# Altium footprint library Power_Lib_Altium.PcbLib: 383 footprints (part 6 of 24)
Each footprint in its own frame and in the unit in brackets; x right, y up, seen from the top. Pads: shape width x height; smd on the part's side, far side on the other; paste and mask are expansions set on the pad; w line width, h text height; cw(c..) or ccw(c..) is an arc to the next point about the centre after c.
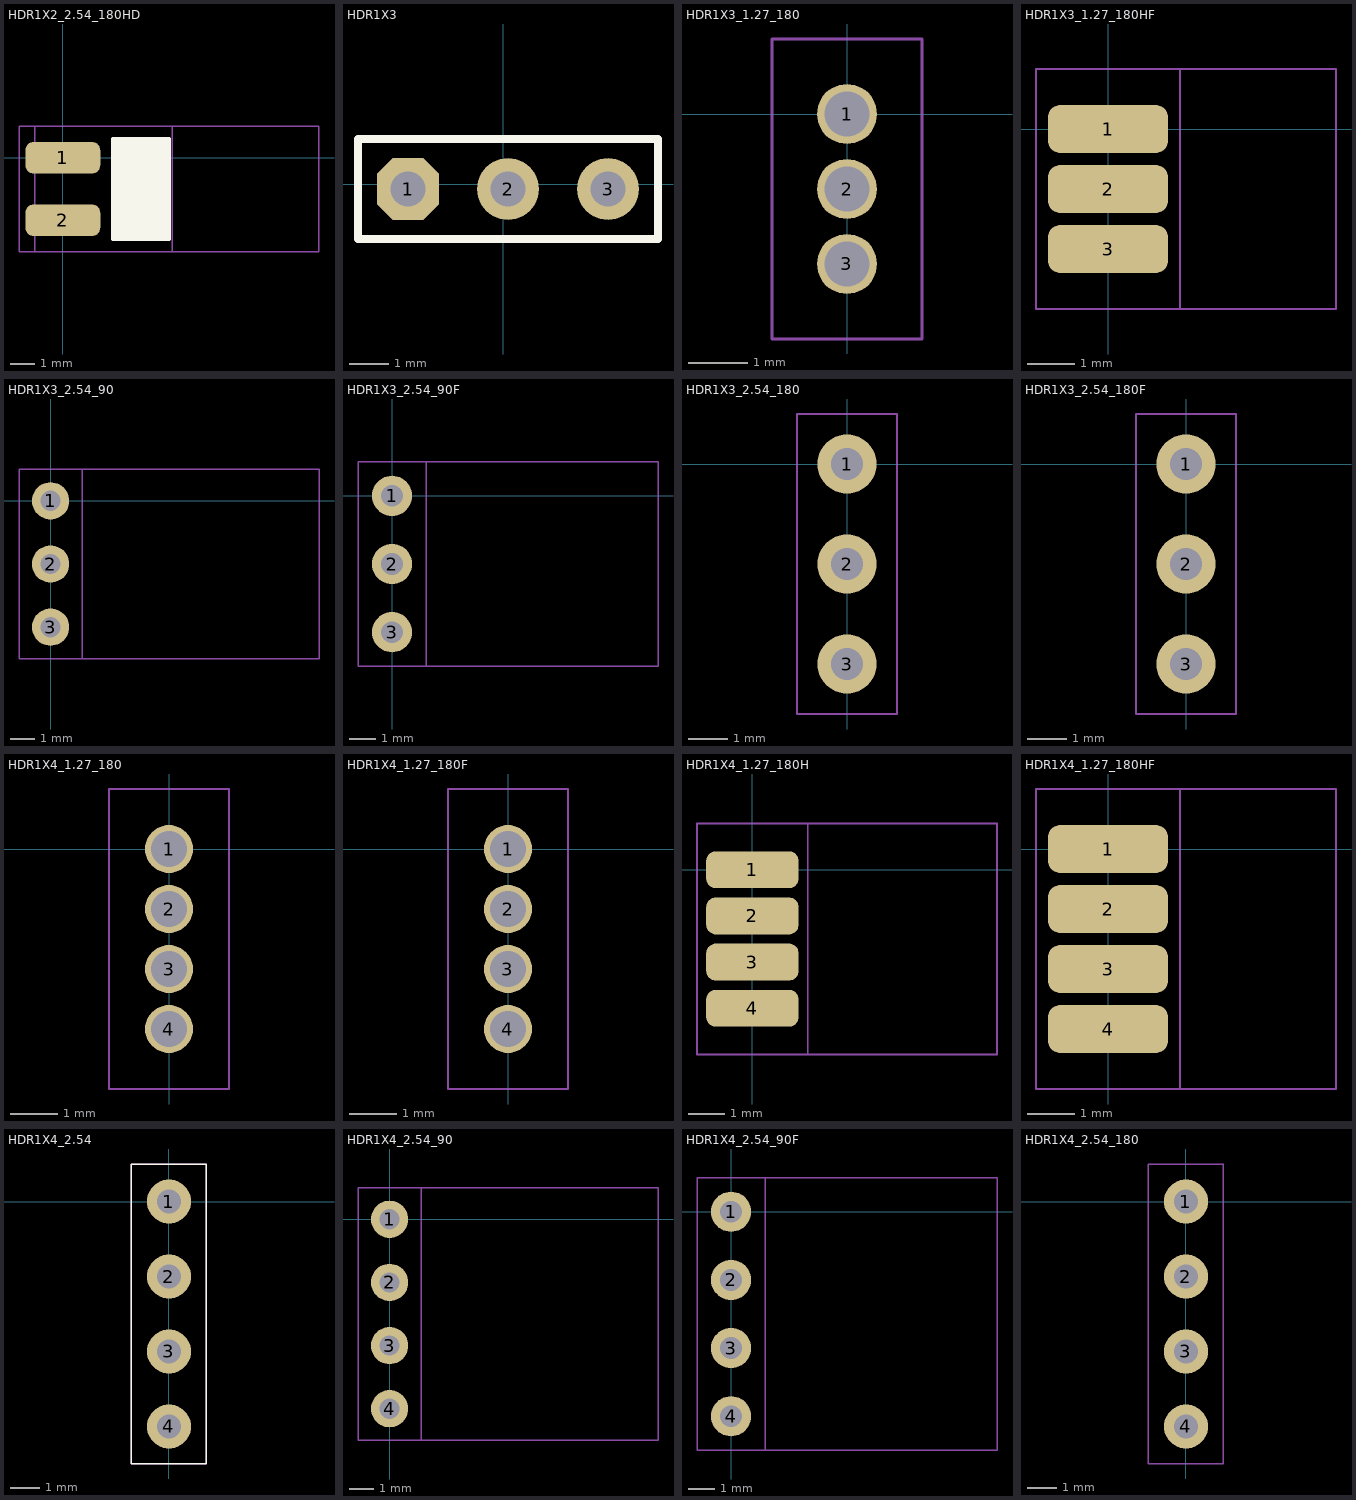
[diagram p5: the footprints below, top view; thin cyan lines are the x and y axes]

## HDR1X2_2.54_180HD [mil]
height 169.29
pads (2):
  rrect50% 120x50 smd: 1(0,0) 2(0,-100)
Top Overlay:
  region: 80,30 170,30 170,-130 80,-130
  lines w6: 80,-130 80,30 170,30 170,-130 80,-130
Mechanical 13:
  lines w2: -45,-150 -45,50 409.65,50 409.65,-150 -45,-150
Mechanical 14:
  lines w2: -70,-150 175,-150 175,50 -70,50 -70,-150
3D body "pin_header_aw140-eg-g02d.stp": height 101.32, standoff 2.95, extent -45.47,-150 395.47,50

## HDR1X3 [mil]
pads (3):
  oct 62x62 hole 35: 1(-95,-5)
  round 62 hole 35: 2(5,-5) 3(105,-5)
Top Overlay:
  lines w8: -145,-55 -145,45 155,45 155,-55 -145,-55
3D body "User Library-Header Vertical 2_54mm Pitch2-11 Way.SLDPRT": height 233.86, standoff -115.75, extent -46,-54.99 54,45.01
3D body "User Library-Header Vertical 2_54mm Pitch2-11 Way.SLDPRT": height 233.86, standoff -115.75, extent -146,-54.99 -46,45.01
3D body "User Library-Header Vertical 2_54mm Pitch2-11 Way.SLDPRT": height 233.86, standoff -115.75, extent 54,-54.99 154,45.01

## HDR1X3_1.27_180 [mil]
height 169.29
pads (3):
  round 40 hole 30: 1(0,0) 2(0,-50) 3(0,-100)
Mechanical 13:
  lines w2: -50,-150 -50,50 50,50 50,-150 -50,-150
Mechanical 14:
  lines w2: -50,-150 -50,50 50,50 50,-150 -50,-150

## HDR1X3_1.27_180HF [mil]
height 169.29
pads (3):
  rrect50% 100x40 smd: 1(0,0) 2(0,-50) 3(0,-100)
Mechanical 13:
  lines w2: -60,-150 -60,50 190,50 190,-150 -60,-150
Mechanical 14:
  lines w2: -60,-150 60,-150 60,50 -60,50 -60,-150
3D body "female_header_a-bl127-eg-g03d.stp": height 35.43, standoff -35.43, extent -38.35,-132.87 190,32.88

## HDR1X3_2.54_90 [mm]
height 4.3
pads (3):
  round 1.5 hole 0.813: 1(0,0) 2(0,-2.54) 3(0,-5.08)
Mechanical 13:
  lines w0.051: -1.27,-6.35 10.795,-6.35 10.795,1.27 -1.27,1.27 -1.27,-6.35
Mechanical 14:
  lines w0.051: -1.27,-6.35 -1.27,1.27 1.27,1.27 1.27,-6.35 -1.27,-6.35
3D body "pin_header_aw140-ea-g03g.stp": height 2.52, standoff -2.38, extent -0.381,-6.25 10.759,1.17

## HDR1X3_2.54_90F [mm]
height 4.3
pads (3):
  round 1.5 hole 0.813: 1(0,0) 2(0,-2.54) 3(0,-5.08)
Mechanical 13:
  lines w0.051: -1.27,-6.35 -1.27,1.27 9.906,1.27 9.906,-6.35 -1.27,-6.35
Mechanical 14:
  lines w0.051: -1.27,-6.35 1.27,-6.35 1.27,1.27 -1.27,1.27 -1.27,-6.35
3D body "female_header_a-bl254-ea-g03d.stp": height 2.52, standoff -3.18, extent -0.254,-6.475 9.806,1.395

## HDR1X3_2.54_180 [mm]
height 4.3
pads (3):
  round 1.5 hole 0.813: 1(0,0) 2(0,-2.54) 3(0,-5.08)
Mechanical 13:
  lines w0.051: -1.27,-6.35 1.27,-6.35 1.27,1.27 -1.27,1.27 -1.27,-6.35
Mechanical 14:
  lines w0.051: -1.27,-6.35 1.27,-6.35 1.27,1.27 -1.27,1.27 -1.27,-6.35
3D body "pin_header_aw140-eg-g03d.stp": height 8.2, standoff -3, extent -1.249,-6.35 1.249,1.27

## HDR1X3_2.54_180F [mm]
height 4.3
pads (3):
  round 1.5 hole 0.813: 1(0,0) 2(0,-2.54) 3(0,-5.08)
Mechanical 13:
  lines w0.051: -1.27,-6.35 1.27,-6.35 1.27,1.27 -1.27,1.27 -1.27,-6.35
Mechanical 14:
  lines w0.051: -1.27,-6.35 1.27,-6.35 1.27,1.27 -1.27,1.27 -1.27,-6.35
3D body "female_header_a-bl254-eg-g03d.stp": height 8.5, standoff -3.2, extent -1.25,-6.475 1.25,1.395

## HDR1X4_1.27_180 [mil]
height 169.29
pads (4):
  round 40 hole 30: 1(0,0) 2(0,-50) 3(0,-100) 4(0,-150)
Mechanical 13:
  lines w2: -50,-200 50,-200 50,50 -50,50 -50,-200
Mechanical 14:
  lines w2: -50,-200 50,-200 50,50 -50,50 -50,-200
3D body "pin_header_a-sl127-eg-g04d.stp": height 210.24, standoff -102.36, extent -49.21,-174.99 49.21,25.01

## HDR1X4_1.27_180F [mil]
height 169.29
pads (4):
  round 40 hole 30: 1(0,0) 2(0,-50) 3(0,-100) 4(0,-150)
Mechanical 13:
  lines w2: -50,-200 50,-200 50,50 -50,50 -50,-200
Mechanical 14:
  lines w2: -50,-200 50,-200 50,50 -50,50 -50,-200
3D body "female_header_a-bl127-eg-g04d.stp": height 133.86, standoff -94.49, extent -35.87,-182.88 35,32.88

## HDR1X4_1.27_180H [mil]
height 169.29
pads (4):
  rrect50% 100x40 smd: 1(0,0) 2(0,-50) 3(0,-100) 4(0,-150)
Mechanical 13:
  lines w2: -60,-200 -60,50 265,50 265,-200 -60,-200
Mechanical 14:
  lines w2: -60,-200 -60,50 60,50 60,-200 -60,-200
3D body "pin_header_a-sl127-eg-g04d.stp": height 59.21, standoff -39.21, extent -47.36,-174.99 265.24,25.01

## HDR1X4_1.27_180HF [mil]
height 169.29
pads (4):
  rrect50% 100x40 smd: 1(0,0) 2(0,-50) 3(0,-100) 4(0,-150)
Mechanical 13:
  lines w2: -60,-200 -60,50 190,50 190,-200 -60,-200
Mechanical 14:
  lines w2: -60,-200 60,-200 60,50 -60,50 -60,-200
3D body "female_header_a-bl127-eg-g04d.stp": height 45.43, standoff -25.43, extent -38.35,-182.88 190,32.88

## HDR1X4_2.54 [mm]
height 4.3
pads (4):
  round 1.5 hole 0.813: 1(0,0) 2(0,-2.54) 3(0,-5.08) 4(0,-7.62)
Top Overlay:
  lines w0.051: -1.27,-8.89 1.27,-8.89 1.27,1.27 -1.27,1.27 -1.27,-8.89
Mechanical 13:
  lines w0.051: -1.27,-8.89 1.27,-8.89 1.27,1.27 -1.27,1.27 -1.27,-8.89
Mechanical 14:
  lines w0.051: -1.27,-8.89 1.27,-8.89 1.27,1.27 -1.27,1.27 -1.27,-8.89

## HDR1X4_2.54_90 [mm]
height 4.3
pads (4):
  round 1.5 hole 0.813: 1(0,0) 2(0,-2.54) 3(0,-5.08) 4(0,-7.62)
Mechanical 13:
  lines w0.051: -1.27,-8.89 10.795,-8.89 10.795,1.27 -1.27,1.27 -1.27,-8.89
Mechanical 14:
  lines w0.051: -1.27,-8.89 -1.27,1.27 1.27,1.27 1.27,-8.89 -1.27,-8.89
3D body "pin_header_aw140-ea-g04g.stp": height 2.52, standoff -2.38, extent -0.38,-8.79 10.76,1.17

## HDR1X4_2.54_90F [mm]
height 4.3
pads (4):
  round 1.5 hole 0.813: 1(0,0) 2(0,-2.54) 3(0,-5.08) 4(0,-7.62)
Mechanical 13:
  lines w0.051: -1.27,-8.89 -1.27,1.27 9.906,1.27 9.906,-8.89 -1.27,-8.89
Mechanical 14:
  lines w0.051: -1.27,-8.89 1.27,-8.89 1.27,1.27 -1.27,1.27 -1.27,-8.89
3D body "female_header_a-bl254-ea-g04d.stp": height 2.52, standoff -3.18, extent -0.254,-9.015 9.806,1.395

## HDR1X4_2.54_180 [mm]
height 4.3
pads (4):
  round 1.5 hole 0.813: 1(0,0) 2(0,-2.54) 3(0,-5.08) 4(0,-7.62)
Mechanical 13:
  lines w0.051: -1.27,-8.89 -1.27,1.27 1.27,1.27 1.27,-8.89 -1.27,-8.89
Mechanical 14:
  lines w0.051: -1.27,-8.89 -1.27,1.27 1.27,1.27 1.27,-8.89 -1.27,-8.89
3D body "pin_header_aw140-eg-g04d.stp": height 8.2, standoff -3, extent -1.249,-8.89 1.249,1.27